# Altium schematic symbol library jlcpcb_2025_04_capacitors_extended_0805.schlib: 3281 symbols (part 1 of 18) (continued)
## 0805B104M500NT
designator C?  Capacitance: 100nF  (hidden comment: *)
Capacitor, Ceramic (MLCC), 100nF, ±20%, 50V, X7R, ±20%, SMD 0805; Manufacturer: FH(Guangdong Fenghua Advanced Tech); Manufacturer Part Number: 0805B104M500NT; Package Size: 0805; JLCPCB Basic Part: No; JLCPCB Part Number: C286511; Supplier 1: LCSC; Category: Capacitors - MLCC; Supplier Part Number 1: C286511; Tolerance: ±20%; Voltage Rating: 50V; Temperature Coefficient: X7R; RoHS: Yes; ComponentLink1Description: Datasheet; ComponentLink1URL: https://wmsc.lcsc.com/wmsc/upload/file/pdf/v2/lcsc/2304140030_FH--Guangdong-Fenghua-Advanced-Tech-0805B104M500NT_C286511.pdf; ComponentLink2Description: JLCPCB Part URL; ComponentLink2URL: https://jlcpcb.com/partdetail/C286511; ComponentLink3Description: LCSC Part URL; ComponentLink3URL: https://lcsc.com/product-detail/Multilayer-Ceramic-Capacitors-MLCC---SMD-SMT_FH-Guangdong-Fenghua-Advanced-Tech-FH-Guangdong-Fenghua-Advanced-Tech-0805B104M500NT_C286511.html
footprint CAP-0805 (0805 (2012M) Capacitor)
pins: 1, 2

## 0805B105K100CT
designator C?  Capacitance: 1uF  (hidden comment: *)
Capacitor, Ceramic (MLCC), 1uF, ±10%, 10V, X7R, ±10%, SMD 0805; Manufacturer: Walsin Tech Corp; Manufacturer Part Number: 0805B105K100CT; Package Size: 0805; JLCPCB Basic Part: No; JLCPCB Part Number: C366879; Supplier 1: LCSC; Category: Capacitors - MLCC; Supplier Part Number 1: C366879; Tolerance: ±10%; Voltage Rating: 10V; Temperature Coefficient: X7R; RoHS: Yes; ComponentLink1Description: Datasheet; ComponentLink1URL: https://wmsc.lcsc.com/wmsc/upload/file/pdf/v2/lcsc/2304140030_Walsin-Tech-Corp-0805B105K100CT_C366879.pdf; ComponentLink2Description: JLCPCB Part URL; ComponentLink2URL: https://jlcpcb.com/partdetail/C366879; ComponentLink3Description: LCSC Part URL; ComponentLink3URL: https://lcsc.com/product-detail/Multilayer-Ceramic-Capacitors-MLCC---SMD-SMT_Walsin-Tech-Corp-Walsin-Tech-Corp-0805B105K100CT_C366879.html
footprint CAP-0805 (0805 (2012M) Capacitor)
pins: 1, 2

## 0805B105K160CT
designator C?  Capacitance: 1uF  (hidden comment: *)
Capacitor, Ceramic (MLCC), 1uF, ±10%, 16V, X7R, ±10%, SMD 0805; Manufacturer: Walsin Tech Corp; Manufacturer Part Number: 0805B105K160CT; Package Size: 0805; JLCPCB Basic Part: No; JLCPCB Part Number: C396719; Supplier 1: LCSC; Category: Capacitors - MLCC; Supplier Part Number 1: C396719; Tolerance: ±10%; Voltage Rating: 16V; Temperature Coefficient: X7R; RoHS: Yes; ComponentLink1Description: Datasheet; ComponentLink1URL: https://wmsc.lcsc.com/wmsc/upload/file/pdf/v2/lcsc/2304140030_Walsin-Tech-Corp-0805B105K160CT_C396719.pdf; ComponentLink2Description: JLCPCB Part URL; ComponentLink2URL: https://jlcpcb.com/partdetail/C396719; ComponentLink3Description: LCSC Part URL; ComponentLink3URL: https://lcsc.com/product-detail/Multilayer-Ceramic-Capacitors-MLCC---SMD-SMT_Walsin-Tech-Corp-Walsin-Tech-Corp-0805B105K160CT_C396719.html
footprint CAP-0805 (0805 (2012M) Capacitor)
pins: 1, 2

## 0805B105K160NT
designator C?  Capacitance: 1uF  (hidden comment: *)
Capacitor, Ceramic (MLCC), 1uF, ±10%, 16V, X7R, ±10%, SMD 0805; Manufacturer: FH(Guangdong Fenghua Advanced Tech); Manufacturer Part Number: 0805B105K160NT; Package Size: 0805; JLCPCB Basic Part: No; JLCPCB Part Number: C89259; Supplier 1: LCSC; Category: Capacitors - MLCC; Supplier Part Number 1: C89259; Tolerance: ±10%; Voltage Rating: 16V; Temperature Coefficient: X7R; RoHS: Yes; ComponentLink1Description: Datasheet; ComponentLink1URL: https://wmsc.lcsc.com/wmsc/upload/file/pdf/v2/lcsc/2304140030_FH--Guangdong-Fenghua-Advanced-Tech-0805B105K160NT_C89259.pdf; ComponentLink2Description: JLCPCB Part URL; ComponentLink2URL: https://jlcpcb.com/partdetail/C89259; ComponentLink3Description: LCSC Part URL; ComponentLink3URL: https://lcsc.com/product-detail/Multilayer-Ceramic-Capacitors-MLCC---SMD-SMT_FH-Guangdong-Fenghua-Advanced-Tech-FH-Guangdong-Fenghua-Advanced-Tech-0805B105K160NT_C89259.html
footprint CAP-0805 (0805 (2012M) Capacitor)
pins: 1, 2

## 0805B105K250AT
designator C?  Capacitance: 1uF  (hidden comment: *)
Capacitor, Ceramic (MLCC), 1uF, ±10%, 25V, X7R, ±10%, SMD 0805; Manufacturer: FH(Guangdong Fenghua Advanced Tech); Manufacturer Part Number: 0805B105K250AT; Package Size: 0805; JLCPCB Basic Part: No; JLCPCB Part Number: C111769; Supplier 1: LCSC; Category: Capacitors - MLCC; Supplier Part Number 1: C111769; Tolerance: ±10%; Voltage Rating: 25V; Temperature Coefficient: X7R; RoHS: Yes; ComponentLink1Description: Datasheet; ComponentLink1URL: https://wmsc.lcsc.com/wmsc/upload/file/pdf/v2/lcsc/2304140030_FH--Guangdong-Fenghua-Advanced-Tech-0805B105K250AT_C111769.pdf; ComponentLink2Description: JLCPCB Part URL; ComponentLink2URL: https://jlcpcb.com/partdetail/C111769; ComponentLink3Description: LCSC Part URL; ComponentLink3URL: https://lcsc.com/product-detail/Multilayer-Ceramic-Capacitors-MLCC---SMD-SMT_FH-Guangdong-Fenghua-Advanced-Tech-FH-Guangdong-Fenghua-Advanced-Tech-0805B105K250AT_C111769.html
footprint CAP-0805 (0805 (2012M) Capacitor)
pins: 1, 2

## 0805B105K250CT
designator C?  Capacitance: 1uF  (hidden comment: *)
Capacitor, Ceramic (MLCC), 1uF, ±10%, 25V, X7R, ±10%, SMD 0805; Manufacturer: Walsin Tech Corp; Manufacturer Part Number: 0805B105K250CT; Package Size: 0805; JLCPCB Basic Part: No; JLCPCB Part Number: C152988; Supplier 1: LCSC; Category: Capacitors - MLCC; Supplier Part Number 1: C152988; Tolerance: ±10%; Voltage Rating: 25V; Temperature Coefficient: X7R; RoHS: Yes; ComponentLink1Description: Datasheet; ComponentLink1URL: https://wmsc.lcsc.com/wmsc/upload/file/pdf/v2/lcsc/2304140030_Walsin-Tech-Corp-0805B105K250CT_C152988.pdf; ComponentLink2Description: JLCPCB Part URL; ComponentLink2URL: https://jlcpcb.com/partdetail/C152988; ComponentLink3Description: LCSC Part URL; ComponentLink3URL: https://lcsc.com/product-detail/Multilayer-Ceramic-Capacitors-MLCC---SMD-SMT_Walsin-Tech-Corp-Walsin-Tech-Corp-0805B105K250CT_C152988.html
footprint CAP-0805 (0805 (2012M) Capacitor)
pins: 1, 2

## 0805B105K250NT
designator C?  Capacitance: 1uF  (hidden comment: *)
Capacitor, Ceramic (MLCC), 1uF, ±10%, 25V, X7R, ±10%, SMD 0805; Manufacturer: FH(Guangdong Fenghua Advanced Tech); Manufacturer Part Number: 0805B105K250NT; Package Size: 0805; JLCPCB Basic Part: No; JLCPCB Part Number: C89190; Supplier 1: LCSC; Category: Capacitors - MLCC; Supplier Part Number 1: C89190; Tolerance: ±10%; Voltage Rating: 25V; Temperature Coefficient: X7R; RoHS: Yes; ComponentLink1Description: Datasheet; ComponentLink1URL: https://wmsc.lcsc.com/wmsc/upload/file/pdf/v2/lcsc/1811111206_FH--Guangdong-Fenghua-Advanced-Tech-0805B105K250NT_C89190.pdf; ComponentLink2Description: JLCPCB Part URL; ComponentLink2URL: https://jlcpcb.com/partdetail/C89190; ComponentLink3Description: LCSC Part URL; ComponentLink3URL: https://lcsc.com/product-detail/Multilayer-Ceramic-Capacitors-MLCC---SMD-SMT_FH-Guangdong-Fenghua-Advanced-Tech-FH-Guangdong-Fenghua-Advanced-Tech-0805B105K250NT_C89190.html
footprint CAP-0805 (0805 (2012M) Capacitor)
pins: 1, 2

## 0805B105K500AT
designator C?  Capacitance: 1uF  (hidden comment: *)
Capacitor, Ceramic (MLCC), 1uF, ±10%, 50V, X7R, ±10%, SMD 0805; Manufacturer: FH(Guangdong Fenghua Advanced Tech); Manufacturer Part Number: 0805B105K500AT; Package Size: 0805; JLCPCB Basic Part: No; JLCPCB Part Number: C111768; Supplier 1: LCSC; Category: Capacitors - MLCC; Supplier Part Number 1: C111768; Tolerance: ±10%; Voltage Rating: 50V; Temperature Coefficient: X7R; RoHS: Yes; ComponentLink1Description: Datasheet; ComponentLink1URL: https://wmsc.lcsc.com/wmsc/upload/file/pdf/v2/lcsc/2304140030_FH--Guangdong-Fenghua-Advanced-Tech-0805B105K500AT_C111768.pdf; ComponentLink2Description: JLCPCB Part URL; ComponentLink2URL: https://jlcpcb.com/partdetail/C111768; ComponentLink3Description: LCSC Part URL; ComponentLink3URL: https://lcsc.com/product-detail/Multilayer-Ceramic-Capacitors-MLCC---SMD-SMT_FH-Guangdong-Fenghua-Advanced-Tech-FH-Guangdong-Fenghua-Advanced-Tech-0805B105K500AT_C111768.html
footprint CAP-0805 (0805 (2012M) Capacitor)
pins: 1, 2

## 0805B105K500CT
designator C?  Capacitance: 1uF  (hidden comment: *)
Capacitor, Ceramic (MLCC), 1uF, ±10%, 50V, X7R, ±10%, SMD 0805; Manufacturer: Walsin Tech Corp; Manufacturer Part Number: 0805B105K500CT; Package Size: 0805; JLCPCB Basic Part: No; JLCPCB Part Number: C99915; Supplier 1: LCSC; Category: Capacitors - MLCC; Supplier Part Number 1: C99915; Tolerance: ±10%; Voltage Rating: 50V; Temperature Coefficient: X7R; RoHS: Yes; ComponentLink1Description: Datasheet; ComponentLink1URL: https://wmsc.lcsc.com/wmsc/upload/file/pdf/v2/lcsc/2304140030_Walsin-Tech-Corp-0805B105K500CT_C99915.pdf; ComponentLink2Description: JLCPCB Part URL; ComponentLink2URL: https://jlcpcb.com/partdetail/C99915; ComponentLink3Description: LCSC Part URL; ComponentLink3URL: https://lcsc.com/product-detail/Multilayer-Ceramic-Capacitors-MLCC---SMD-SMT_Walsin-Tech-Corp-Walsin-Tech-Corp-0805B105K500CT_C99915.html
footprint CAP-0805 (0805 (2012M) Capacitor)
pins: 1, 2

## 0805B105K500NT
designator C?  Capacitance: 1uF  (hidden comment: *)
Capacitor, Ceramic (MLCC), 1uF, ±10%, 50V, X7R, ±10%, SMD 0805; Manufacturer: FH(Guangdong Fenghua Advanced Tech); Manufacturer Part Number: 0805B105K500NT; Package Size: 0805; JLCPCB Basic Part: No; JLCPCB Part Number: C215803; Supplier 1: LCSC; Category: Capacitors - MLCC; Supplier Part Number 1: C215803; Tolerance: ±10%; Voltage Rating: 50V; Temperature Coefficient: X7R; RoHS: Yes; ComponentLink1Description: Datasheet; ComponentLink1URL: https://wmsc.lcsc.com/wmsc/upload/file/pdf/v2/lcsc/2304140030_FH--Guangdong-Fenghua-Advanced-Tech-0805B105K500NT_C215803.pdf; ComponentLink2Description: JLCPCB Part URL; ComponentLink2URL: https://jlcpcb.com/partdetail/C215803; ComponentLink3Description: LCSC Part URL; ComponentLink3URL: https://lcsc.com/product-detail/Multilayer-Ceramic-Capacitors-MLCC---SMD-SMT_FH-Guangdong-Fenghua-Advanced-Tech-FH-Guangdong-Fenghua-Advanced-Tech-0805B105K500NT_C215803.html
footprint CAP-0805 (0805 (2012M) Capacitor)
pins: 1, 2

## 0805B105M250AT
designator C?  Capacitance: 1000000pF  (hidden comment: *)
Capacitor, Ceramic (MLCC), 1000000pF, ±20%, 25V, X7R, ±20%, SMD 0805; Manufacturer: FH (Guangdong Fenghua Advanced Tech); Manufacturer Part Number: 0805B105M250AT; Package Size: 0805; JLCPCB Basic Part: No; JLCPCB Part Number: C2857989; Supplier 1: LCSC; Category: Capacitors - MLCC; Supplier Part Number 1: C2857989; Tolerance: ±20%; Voltage Rating: 25V; Temperature Coefficient: X7R; RoHS: Yes; ComponentLink1Description: Datasheet; ComponentLink2Description: JLCPCB Part URL; ComponentLink2URL: https://jlcpcb.com/partdetail/C2857989; ComponentLink3Description: LCSC Part URL; ComponentLink3URL: https://lcsc.com/product-detail/Multilayer-Ceramic-Capacitors-MLCC---SMD-SMT_FH-Guangdong-Fenghua-Advanced-Tech-FH-Guangdong-Fenghua-Advanced-Tech-0805B105M250AT_C2857989.html
footprint CAP-0805 (0805 (2012M) Capacitor)
pins: 1, 2

## 0805B105M250NT
designator C?  Capacitance: 1000000pF  (hidden comment: *)
Capacitor, Ceramic (MLCC), 1000000pF, ±20%, 25V, X7R, ±20%, SMD 0805; Manufacturer: FH (Guangdong Fenghua Advanced Tech); Manufacturer Part Number: 0805B105M250NT; Package Size: 0805; JLCPCB Basic Part: No; JLCPCB Part Number: C303896; Supplier 1: LCSC; Category: Capacitors - MLCC; Supplier Part Number 1: C303896; Tolerance: ±20%; Voltage Rating: 25V; Temperature Coefficient: X7R; RoHS: Yes; ComponentLink1Description: Datasheet; ComponentLink1URL: https://wmsc.lcsc.com/wmsc/upload/file/pdf/v2/lcsc/2304140030_FH--Guangdong-Fenghua-Advanced-Tech-0805B105M250NT_C303896.pdf; ComponentLink2Description: JLCPCB Part URL; ComponentLink2URL: https://jlcpcb.com/partdetail/C303896; ComponentLink3Description: LCSC Part URL; ComponentLink3URL: https://lcsc.com/product-detail/Multilayer-Ceramic-Capacitors-MLCC---SMD-SMT_FH-Guangdong-Fenghua-Advanced-Tech-FH-Guangdong-Fenghua-Advanced-Tech-0805B105M250NT_C303896.html
footprint CAP-0805 (0805 (2012M) Capacitor)
pins: 1, 2

## 0805B105M500AT
designator C?  Capacitance: 1uF  (hidden comment: *)
Capacitor, Ceramic (MLCC), 1uF, 50V, SMD 0805; Manufacturer: FH (Guangdong Fenghua Advanced Tech); Manufacturer Part Number: 0805B105M500AT; Package Size: 0805; JLCPCB Basic Part: No; JLCPCB Part Number: C2857990; Supplier 1: LCSC; Category: Capacitors - MLCC; Supplier Part Number 1: C2857990; Voltage Rating: 50V; RoHS: Yes; ComponentLink1Description: Datasheet; ComponentLink2Description: JLCPCB Part URL; ComponentLink2URL: https://jlcpcb.com/partdetail/C2857990; ComponentLink3Description: LCSC Part URL; ComponentLink3URL: https://lcsc.com/product-detail/Multilayer-Ceramic-Capacitors-MLCC---SMD-SMT_FH-Guangdong-Fenghua-Advanced-Tech-FH-Guangdong-Fenghua-Advanced-Tech-0805B105M500AT_C2857990.html
footprint CAP-0805 (0805 (2012M) Capacitor)
pins: 1, 2

## 0805B105M500NT
designator C?  Capacitance: 1uF  (hidden comment: *)
Capacitor, Ceramic (MLCC), 1uF, 50V, X7R, SMD 0805; Manufacturer: FH (Guangdong Fenghua Advanced Tech); Manufacturer Part Number: 0805B105M500NT; Package Size: 0805; JLCPCB Basic Part: No; JLCPCB Part Number: C2913555; Supplier 1: LCSC; Category: Capacitors - MLCC; Supplier Part Number 1: C2913555; Voltage Rating: 50V; Temperature Coefficient: X7R; RoHS: Yes; ComponentLink1Description: Datasheet; ComponentLink1URL: https://wmsc.lcsc.com/wmsc/upload/file/pdf/v2/lcsc/2111011830_FH--Guangdong-Fenghua-Advanced-Tech-0805B105M500NT_C2913555.pdf; ComponentLink2Description: JLCPCB Part URL; ComponentLink2URL: https://jlcpcb.com/partdetail/C2913555; ComponentLink3Description: LCSC Part URL; ComponentLink3URL: https://lcsc.com/product-detail/Multilayer-Ceramic-Capacitors-MLCC---SMD-SMT_FH-Guangdong-Fenghua-Advanced-Tech-FH-Guangdong-Fenghua-Advanced-Tech-0805B105M500NT_C2913555.html
footprint CAP-0805 (0805 (2012M) Capacitor)
pins: 1, 2

## 0805B106K6R3CT
designator C?  Capacitance: 10uF  (hidden comment: *)
Capacitor, Ceramic (MLCC), 10uF, ±10%, 6.3V, X7R, ±10%, SMD 0805; Manufacturer: Walsin Tech Corp; Manufacturer Part Number: 0805B106K6R3CT; Package Size: 0805; JLCPCB Basic Part: No; JLCPCB Part Number: C396721; Supplier 1: LCSC; Category: Capacitors - MLCC; Supplier Part Number 1: C396721; Tolerance: ±10%; Voltage Rating: 6.3V; Temperature Coefficient: X7R; RoHS: Yes; ComponentLink1Description: Datasheet; ComponentLink1URL: https://wmsc.lcsc.com/wmsc/upload/file/pdf/v2/lcsc/2304140030_Walsin-Tech-Corp-0805B106K6R3CT_C396721.pdf; ComponentLink2Description: JLCPCB Part URL; ComponentLink2URL: https://jlcpcb.com/partdetail/C396721; ComponentLink3Description: LCSC Part URL; ComponentLink3URL: https://lcsc.com/product-detail/Multilayer-Ceramic-Capacitors-MLCC---SMD-SMT_Walsin-Tech-Corp-Walsin-Tech-Corp-0805B106K6R3CT_C396721.html
footprint CAP-0805 (0805 (2012M) Capacitor)
pins: 1, 2

## 0805B106K6R3NT
designator C?  Capacitance: 10uF  (hidden comment: *)
Capacitor, Ceramic (MLCC), 10uF, ±10%, 6.3V, X7R, ±10%, SMD 0805; Manufacturer: FH(Guangdong Fenghua Advanced Tech); Manufacturer Part Number: 0805B106K6R3NT; Package Size: 0805; JLCPCB Basic Part: No; JLCPCB Part Number: C105483; Supplier 1: LCSC; Category: Capacitors - MLCC; Supplier Part Number 1: C105483; Tolerance: ±10%; Voltage Rating: 6.3V; Temperature Coefficient: X7R; RoHS: Yes; ComponentLink1Description: Datasheet; ComponentLink1URL: https://wmsc.lcsc.com/wmsc/upload/file/pdf/v2/lcsc/2304140030_FH--Guangdong-Fenghua-Advanced-Tech-0805B106K6R3NT_C105483.pdf; ComponentLink2Description: JLCPCB Part URL; ComponentLink2URL: https://jlcpcb.com/partdetail/C105483; ComponentLink3Description: LCSC Part URL; ComponentLink3URL: https://lcsc.com/product-detail/Multilayer-Ceramic-Capacitors-MLCC---SMD-SMT_FH-Guangdong-Fenghua-Advanced-Tech-FH-Guangdong-Fenghua-Advanced-Tech-0805B106K6R3NT_C105483.html
footprint CAP-0805 (0805 (2012M) Capacitor)
pins: 1, 2

## 0805B106K100CT
designator C?  Capacitance: 10uF  (hidden comment: *)
Capacitor, Ceramic (MLCC), 10uF, ±10%, 10V, X7R, ±10%, SMD 0805; Manufacturer: Walsin Tech Corp; Manufacturer Part Number: 0805B106K100CT; Package Size: 0805; JLCPCB Basic Part: No; JLCPCB Part Number: C396720; Supplier 1: LCSC; Category: Capacitors - MLCC; Supplier Part Number 1: C396720; Tolerance: ±10%; Voltage Rating: 10V; Temperature Coefficient: X7R; RoHS: Yes; ComponentLink1Description: Datasheet; ComponentLink1URL: https://wmsc.lcsc.com/wmsc/upload/file/pdf/v2/lcsc/2304140030_Walsin-Tech-Corp-0805B106K100CT_C396720.pdf; ComponentLink2Description: JLCPCB Part URL; ComponentLink2URL: https://jlcpcb.com/partdetail/C396720; ComponentLink3Description: LCSC Part URL; ComponentLink3URL: https://lcsc.com/product-detail/Multilayer-Ceramic-Capacitors-MLCC---SMD-SMT_Walsin-Tech-Corp-Walsin-Tech-Corp-0805B106K100CT_C396720.html
footprint CAP-0805 (0805 (2012M) Capacitor)
pins: 1, 2

## 0805B106K100NT
designator C?  Capacitance: 10uF  (hidden comment: *)
Capacitor, Ceramic (MLCC), 10uF, ±10%, 10V, X7R, ±10%, SMD 0805; Manufacturer: FH(Guangdong Fenghua Advanced Tech); Manufacturer Part Number: 0805B106K100NT; Package Size: 0805; JLCPCB Basic Part: No; JLCPCB Part Number: C90544; Supplier 1: LCSC; Category: Capacitors - MLCC; Supplier Part Number 1: C90544; Tolerance: ±10%; Voltage Rating: 10V; Temperature Coefficient: X7R; RoHS: Yes; ComponentLink1Description: Datasheet; ComponentLink1URL: https://wmsc.lcsc.com/wmsc/upload/file/pdf/v2/lcsc/2304140030_FH--Guangdong-Fenghua-Advanced-Tech-0805B106K100NT_C90544.pdf; ComponentLink2Description: JLCPCB Part URL; ComponentLink2URL: https://jlcpcb.com/partdetail/C90544; ComponentLink3Description: LCSC Part URL; ComponentLink3URL: https://lcsc.com/product-detail/Multilayer-Ceramic-Capacitors-MLCC---SMD-SMT_FH-Guangdong-Fenghua-Advanced-Tech-FH-Guangdong-Fenghua-Advanced-Tech-0805B106K100NT_C90544.html
footprint CAP-0805 (0805 (2012M) Capacitor)
pins: 1, 2

## 0805B106K160NT
designator C?  Capacitance: 10uF  (hidden comment: *)
Capacitor, Ceramic (MLCC), 10uF, ±10%, 16V, X7R, ±10%, SMD 0805; Manufacturer: FH(Guangdong Fenghua Advanced Tech); Manufacturer Part Number: 0805B106K160NT; Package Size: 0805; JLCPCB Basic Part: No; JLCPCB Part Number: C92341; Supplier 1: LCSC; Category: Capacitors - MLCC; Supplier Part Number 1: C92341; Tolerance: ±10%; Voltage Rating: 16V; Temperature Coefficient: X7R; RoHS: Yes; ComponentLink1Description: Datasheet; ComponentLink1URL: https://wmsc.lcsc.com/wmsc/upload/file/pdf/v2/lcsc/2304140030_FH--Guangdong-Fenghua-Advanced-Tech-0805B106K160NT_C92341.pdf; ComponentLink2Description: JLCPCB Part URL; ComponentLink2URL: https://jlcpcb.com/partdetail/C92341; ComponentLink3Description: LCSC Part URL; ComponentLink3URL: https://lcsc.com/product-detail/Multilayer-Ceramic-Capacitors-MLCC---SMD-SMT_FH-Guangdong-Fenghua-Advanced-Tech-FH-Guangdong-Fenghua-Advanced-Tech-0805B106K160NT_C92341.html
footprint CAP-0805 (0805 (2012M) Capacitor)
pins: 1, 2

## 0805B121K500CT
designator C?  Capacitance: 120pF  (hidden comment: *)
Capacitor, Ceramic (MLCC), 120pF, ±10%, 50V, X7R, ±10%, SMD 0805; Manufacturer: Walsin Tech Corp; Manufacturer Part Number: 0805B121K500CT; Package Size: 0805; JLCPCB Basic Part: No; JLCPCB Part Number: C152889; Supplier 1: LCSC; Category: Capacitors - MLCC; Supplier Part Number 1: C152889; Tolerance: ±10%; Voltage Rating: 50V; Temperature Coefficient: X7R; RoHS: Yes; ComponentLink1Description: Datasheet; ComponentLink1URL: https://wmsc.lcsc.com/wmsc/upload/file/pdf/v2/lcsc/2304140030_Walsin-Tech-Corp-0805B121K500CT_C152889.pdf; ComponentLink2Description: JLCPCB Part URL; ComponentLink2URL: https://jlcpcb.com/partdetail/C152889; ComponentLink3Description: LCSC Part URL; ComponentLink3URL: https://lcsc.com/product-detail/Multilayer-Ceramic-Capacitors-MLCC---SMD-SMT_Walsin-Tech-Corp-Walsin-Tech-Corp-0805B121K500CT_C152889.html
footprint CAP-0805 (0805 (2012M) Capacitor)
pins: 1, 2

## 0805B121K501CT
designator C?  Capacitance: 120pF  (hidden comment: *)
Capacitor, Ceramic (MLCC), 120pF, ±10%, 500V, X7R, ±10%, SMD 0805; Manufacturer: Walsin Tech Corp; Manufacturer Part Number: 0805B121K501CT; Package Size: 0805; JLCPCB Basic Part: No; JLCPCB Part Number: C2843579; Supplier 1: LCSC; Category: Capacitors - MLCC; Supplier Part Number 1: C2843579; Tolerance: ±10%; Voltage Rating: 500V; Temperature Coefficient: X7R; RoHS: Yes; ComponentLink1Description: Datasheet; ComponentLink1URL: https://wmsc.lcsc.com/wmsc/upload/file/pdf/v2/lcsc/2108072030_Walsin-Tech-Corp-0805B121K501CT_C2843579.pdf; ComponentLink2Description: JLCPCB Part URL; ComponentLink2URL: https://jlcpcb.com/partdetail/C2843579; ComponentLink3Description: LCSC Part URL; ComponentLink3URL: https://lcsc.com/product-detail/Multilayer-Ceramic-Capacitors-MLCC---SMD-SMT_Walsin-Tech-Corp-Walsin-Tech-Corp-0805B121K501CT_C2843579.html
footprint CAP-0805 (0805 (2012M) Capacitor)
pins: 1, 2

## 0805B122K101CT
designator C?  Capacitance: 1.2nF  (hidden comment: *)
Capacitor, Ceramic (MLCC), 1.2nF, ±10%, 100V, X7R, ±10%, SMD 0805; Manufacturer: Walsin Tech Corp; Manufacturer Part Number: 0805B122K101CT; Package Size: 0805; JLCPCB Basic Part: No; JLCPCB Part Number: C384772; Supplier 1: LCSC; Category: Capacitors - MLCC; Supplier Part Number 1: C384772; Tolerance: ±10%; Voltage Rating: 100V; Temperature Coefficient: X7R; RoHS: Yes; ComponentLink1Description: Datasheet; ComponentLink1URL: https://wmsc.lcsc.com/wmsc/upload/file/pdf/v2/lcsc/2304140030_Walsin-Tech-Corp-0805B122K101CT_C384772.pdf; ComponentLink2Description: JLCPCB Part URL; ComponentLink2URL: https://jlcpcb.com/partdetail/C384772; ComponentLink3Description: LCSC Part URL; ComponentLink3URL: https://lcsc.com/product-detail/Multilayer-Ceramic-Capacitors-MLCC---SMD-SMT_Walsin-Tech-Corp-Walsin-Tech-Corp-0805B122K101CT_C384772.html
footprint CAP-0805 (0805 (2012M) Capacitor)
pins: 1, 2

## 0805B122K201NT
designator C?  Capacitance: 1200pF  (hidden comment: *)
Capacitor, Ceramic (MLCC), 1200pF, ±10%, 200V, X7R, ±10%, SMD 0805; Manufacturer: FH (Guangdong Fenghua Advanced Tech); Manufacturer Part Number: 0805B122K201NT; Package Size: 0805; JLCPCB Basic Part: No; JLCPCB Part Number: C880418; Supplier 1: LCSC; Category: Capacitors - MLCC; Supplier Part Number 1: C880418; Tolerance: ±10%; Voltage Rating: 200V; Temperature Coefficient: X7R; RoHS: Yes; ComponentLink1Description: Datasheet; ComponentLink1URL: https://wmsc.lcsc.com/wmsc/upload/file/pdf/v2/lcsc/2304140030_FH--Guangdong-Fenghua-Advanced-Tech-0805B122K201NT_C880418.pdf; ComponentLink2Description: JLCPCB Part URL; ComponentLink2URL: https://jlcpcb.com/partdetail/C880418; ComponentLink3Description: LCSC Part URL; ComponentLink3URL: https://lcsc.com/product-detail/Multilayer-Ceramic-Capacitors-MLCC---SMD-SMT_FH-Guangdong-Fenghua-Advanced-Tech-FH-Guangdong-Fenghua-Advanced-Tech-0805B122K201NT_C880418.html
footprint CAP-0805 (0805 (2012M) Capacitor)
pins: 1, 2

## 0805B122K500CT
designator C?  Capacitance: 1.2nF  (hidden comment: *)
Capacitor, Ceramic (MLCC), 1.2nF, ±10%, 50V, X7R, ±10%, SMD 0805; Manufacturer: Walsin Tech Corp; Manufacturer Part Number: 0805B122K500CT; Package Size: 0805; JLCPCB Basic Part: No; JLCPCB Part Number: C152888; Supplier 1: LCSC; Category: Capacitors - MLCC; Supplier Part Number 1: C152888; Tolerance: ±10%; Voltage Rating: 50V; Temperature Coefficient: X7R; RoHS: Yes; ComponentLink1Description: Datasheet; ComponentLink1URL: https://wmsc.lcsc.com/wmsc/upload/file/pdf/v2/lcsc/2304140030_Walsin-Tech-Corp-0805B122K500CT_C152888.pdf; ComponentLink2Description: JLCPCB Part URL; ComponentLink2URL: https://jlcpcb.com/partdetail/C152888; ComponentLink3Description: LCSC Part URL; ComponentLink3URL: https://lcsc.com/product-detail/Multilayer-Ceramic-Capacitors-MLCC---SMD-SMT_Walsin-Tech-Corp-Walsin-Tech-Corp-0805B122K500CT_C152888.html
footprint CAP-0805 (0805 (2012M) Capacitor)
pins: 1, 2

## 0805B122K500NT
designator C?  Capacitance: 1.2nF  (hidden comment: *)
Capacitor, Ceramic (MLCC), 1.2nF, ±10%, 50V, X7R, ±10%, SMD 0805; Manufacturer: FH(Guangdong Fenghua Advanced Tech); Manufacturer Part Number: 0805B122K500NT; Package Size: 0805; JLCPCB Basic Part: No; JLCPCB Part Number: C1714; Supplier 1: LCSC; Category: Capacitors - MLCC; Supplier Part Number 1: C1714; Tolerance: ±10%; Voltage Rating: 50V; Temperature Coefficient: X7R; RoHS: Yes; ComponentLink1Description: Datasheet; ComponentLink1URL: https://wmsc.lcsc.com/wmsc/upload/file/pdf/v2/lcsc/2304140030_FH--Guangdong-Fenghua-Advanced-Tech-0805B122K500NT_C1714.pdf; ComponentLink2Description: JLCPCB Part URL; ComponentLink2URL: https://jlcpcb.com/partdetail/C1714; ComponentLink3Description: LCSC Part URL; ComponentLink3URL: https://lcsc.com/product-detail/Multilayer-Ceramic-Capacitors-MLCC---SMD-SMT_FH-Guangdong-Fenghua-Advanced-Tech-FH-Guangdong-Fenghua-Advanced-Tech-0805B122K500NT_C1714.html
footprint CAP-0805 (0805 (2012M) Capacitor)
pins: 1, 2

## 0805B123K500CT
designator C?  Capacitance: 12nF  (hidden comment: *)
Capacitor, Ceramic (MLCC), 12nF, ±10%, 50V, X7R, ±10%, SMD 0805; Manufacturer: Walsin Tech Corp; Manufacturer Part Number: 0805B123K500CT; Package Size: 0805; JLCPCB Basic Part: No; JLCPCB Part Number: C123614; Supplier 1: LCSC; Category: Capacitors - MLCC; Supplier Part Number 1: C123614; Tolerance: ±10%; Voltage Rating: 50V; Temperature Coefficient: X7R; RoHS: Yes; ComponentLink1Description: Datasheet; ComponentLink1URL: https://wmsc.lcsc.com/wmsc/upload/file/pdf/v2/lcsc/2304140030_Walsin-Tech-Corp-0805B123K500CT_C123614.pdf; ComponentLink2Description: JLCPCB Part URL; ComponentLink2URL: https://jlcpcb.com/partdetail/C123614; ComponentLink3Description: LCSC Part URL; ComponentLink3URL: https://lcsc.com/product-detail/Multilayer-Ceramic-Capacitors-MLCC---SMD-SMT_Walsin-Tech-Corp-Walsin-Tech-Corp-0805B123K500CT_C123614.html
footprint CAP-0805 (0805 (2012M) Capacitor)
pins: 1, 2

## 0805B123K500NT
designator C?  Capacitance: 12nF  (hidden comment: *)
Capacitor, Ceramic (MLCC), 12nF, ±10%, 50V, X7R, ±10%, SMD 0805; Manufacturer: FH(Guangdong Fenghua Advanced Tech); Manufacturer Part Number: 0805B123K500NT; Package Size: 0805; JLCPCB Basic Part: No; JLCPCB Part Number: C1715; Supplier 1: LCSC; Category: Capacitors - MLCC; Supplier Part Number 1: C1715; Tolerance: ±10%; Voltage Rating: 50V; Temperature Coefficient: X7R; RoHS: Yes; ComponentLink1Description: Datasheet; ComponentLink1URL: https://wmsc.lcsc.com/wmsc/upload/file/pdf/v2/lcsc/2304140030_FH--Guangdong-Fenghua-Advanced-Tech-0805B123K500NT_C1715.pdf; ComponentLink2Description: JLCPCB Part URL; ComponentLink2URL: https://jlcpcb.com/partdetail/C1715; ComponentLink3Description: LCSC Part URL; ComponentLink3URL: https://lcsc.com/product-detail/Multilayer-Ceramic-Capacitors-MLCC---SMD-SMT_FH-Guangdong-Fenghua-Advanced-Tech-FH-Guangdong-Fenghua-Advanced-Tech-0805B123K500NT_C1715.html
footprint CAP-0805 (0805 (2012M) Capacitor)
pins: 1, 2

## 0805B124K500
designator C?  Capacitance: 120nF  (hidden comment: *)
Capacitor, Ceramic (MLCC), 120nF, ±10%, 50V, X7R, ±10%, SMD 0805; Manufacturer: Walsin Tech Corp; Manufacturer Part Number: 0805B124K500; Package Size: 0805; JLCPCB Basic Part: No; JLCPCB Part Number: C152887; Supplier 1: LCSC; Category: Capacitors - MLCC; Supplier Part Number 1: C152887; Tolerance: ±10%; Voltage Rating: 50V; Temperature Coefficient: X7R; RoHS: Yes; ComponentLink1Description: Datasheet; ComponentLink1URL: https://wmsc.lcsc.com/wmsc/upload/file/pdf/v2/lcsc/2304140030_Walsin-Tech-Corp-0805B124K500_C152887.pdf; ComponentLink2Description: JLCPCB Part URL; ComponentLink2URL: https://jlcpcb.com/partdetail/C152887; ComponentLink3Description: LCSC Part URL; ComponentLink3URL: https://lcsc.com/product-detail/Multilayer-Ceramic-Capacitors-MLCC---SMD-SMT_Walsin-Tech-Corp-Walsin-Tech-Corp-0805B124K500_C152887.html
footprint CAP-0805 (0805 (2012M) Capacitor)
pins: 1, 2

## 0805B124K500NT_C55420
designator C?  Capacitance: 120nF  (hidden comment: *)
Capacitor, Ceramic (MLCC), 120nF, ±10%, 50V, X7R, ±10%, SMD 0805; Manufacturer: FH(Guangdong Fenghua Advanced Tech); Manufacturer Part Number: 0805B124K500NT; Package Size: 0805; JLCPCB Basic Part: No; JLCPCB Part Number: C55420; Supplier 1: LCSC; Category: Capacitors - MLCC; Supplier Part Number 1: C55420; Tolerance: ±10%; Voltage Rating: 50V; Temperature Coefficient: X7R; RoHS: Yes; ComponentLink1Description: Datasheet; ComponentLink1URL: https://wmsc.lcsc.com/wmsc/upload/file/pdf/v2/lcsc/2304140030_FH--Guangdong-Fenghua-Advanced-Tech-0805B124K500NT_C55420.pdf; ComponentLink2Description: JLCPCB Part URL; ComponentLink2URL: https://jlcpcb.com/partdetail/C55420; ComponentLink3Description: LCSC Part URL; ComponentLink3URL: https://lcsc.com/product-detail/Multilayer-Ceramic-Capacitors-MLCC---SMD-SMT_FH-Guangdong-Fenghua-Advanced-Tech-FH-Guangdong-Fenghua-Advanced-Tech-0805B124K500NT_C55420.html
footprint CAP-0805 (0805 (2012M) Capacitor)
pins: 1, 2

## 0805B124K500NT_C2830719
designator C?  Capacitance: 120nF  (hidden comment: *)
Capacitor, Ceramic (MLCC), 120nF, ±10%, 50V, ±10%, SMD 0805; Manufacturer: FH-BK(Guangdong Fenghua Bangke Elec); Manufacturer Part Number: 0805B124K500NT; Package Size: 0805; JLCPCB Basic Part: No; JLCPCB Part Number: C2830719; Supplier 1: LCSC; Category: Capacitors - MLCC; Supplier Part Number 1: C2830719; Tolerance: ±10%; Voltage Rating: 50V; RoHS: Yes; ComponentLink1Description: Datasheet; ComponentLink1URL: https://wmsc.lcsc.com/wmsc/upload/file/pdf/v2/lcsc/2105241611_FH-BK-Guangdong-Fenghua-Bangke-Elec-0805B124K500NT_C2830719.pdf; ComponentLink2Description: JLCPCB Part URL; ComponentLink2URL: https://jlcpcb.com/partdetail/C2830719; ComponentLink3Description: LCSC Part URL; ComponentLink3URL: https://lcsc.com/product-detail/Multilayer-Ceramic-Capacitors-MLCC---SMD-SMT_FH-BKGuangdong-Fenghua-Bangke-Elec-FH-BKGuangdong-Fenghua-Bangke-Elec-0805B124K500NT_C2830719.html
footprint CAP-0805 (0805 (2012M) Capacitor)
pins: 1, 2

## 0805B151K500CT
designator C?  Capacitance: 150pF  (hidden comment: *)
Capacitor, Ceramic (MLCC), 150pF, ±10%, 50V, X7R, ±10%, SMD 0805; Manufacturer: Walsin Tech Corp; Manufacturer Part Number: 0805B151K500CT; Package Size: 0805; JLCPCB Basic Part: No; JLCPCB Part Number: C152886; Supplier 1: LCSC; Category: Capacitors - MLCC; Supplier Part Number 1: C152886; Tolerance: ±10%; Voltage Rating: 50V; Temperature Coefficient: X7R; RoHS: Yes; ComponentLink1Description: Datasheet; ComponentLink1URL: https://wmsc.lcsc.com/wmsc/upload/file/pdf/v2/lcsc/2304140030_Walsin-Tech-Corp-0805B151K500CT_C152886.pdf; ComponentLink2Description: JLCPCB Part URL; ComponentLink2URL: https://jlcpcb.com/partdetail/C152886; ComponentLink3Description: LCSC Part URL; ComponentLink3URL: https://lcsc.com/product-detail/Multilayer-Ceramic-Capacitors-MLCC---SMD-SMT_Walsin-Tech-Corp-Walsin-Tech-Corp-0805B151K500CT_C152886.html
footprint CAP-0805 (0805 (2012M) Capacitor)
pins: 1, 2

## 0805B151K500NT
designator C?  Capacitance: 150pF  (hidden comment: *)
Capacitor, Ceramic (MLCC), 150pF, ±10%, 50V, X7R, ±10%, SMD 0805; Manufacturer: FH(Guangdong Fenghua Advanced Tech); Manufacturer Part Number: 0805B151K500NT; Package Size: 0805; JLCPCB Basic Part: No; JLCPCB Part Number: C1716; Supplier 1: LCSC; Category: Capacitors - MLCC; Supplier Part Number 1: C1716; Tolerance: ±10%; Voltage Rating: 50V; Temperature Coefficient: X7R; RoHS: Yes; ComponentLink1Description: Datasheet; ComponentLink1URL: https://wmsc.lcsc.com/wmsc/upload/file/pdf/v2/lcsc/2304140030_FH--Guangdong-Fenghua-Advanced-Tech-0805B151K500NT_C1716.pdf; ComponentLink2Description: JLCPCB Part URL; ComponentLink2URL: https://jlcpcb.com/partdetail/C1716; ComponentLink3Description: LCSC Part URL; ComponentLink3URL: https://lcsc.com/product-detail/Multilayer-Ceramic-Capacitors-MLCC---SMD-SMT_FH-Guangdong-Fenghua-Advanced-Tech-FH-Guangdong-Fenghua-Advanced-Tech-0805B151K500NT_C1716.html
footprint CAP-0805 (0805 (2012M) Capacitor)
pins: 1, 2

## 0805B151K501CT
designator C?  Capacitance: 150pF  (hidden comment: *)
Capacitor, Ceramic (MLCC), 150pF, ±10%, 500V, X7R, ±10%, SMD 0805; Manufacturer: Walsin Tech Corp; Manufacturer Part Number: 0805B151K501CT; Package Size: 0805; JLCPCB Basic Part: No; JLCPCB Part Number: C152986; Supplier 1: LCSC; Category: Capacitors - MLCC; Supplier Part Number 1: C152986; Tolerance: ±10%; Voltage Rating: 500V; Temperature Coefficient: X7R; RoHS: Yes; ComponentLink1Description: Datasheet; ComponentLink1URL: https://wmsc.lcsc.com/wmsc/upload/file/pdf/v2/lcsc/2304140030_Walsin-Tech-Corp-0805B151K501CT_C152986.pdf; ComponentLink2Description: JLCPCB Part URL; ComponentLink2URL: https://jlcpcb.com/partdetail/C152986; ComponentLink3Description: LCSC Part URL; ComponentLink3URL: https://lcsc.com/product-detail/Multilayer-Ceramic-Capacitors-MLCC---SMD-SMT_Walsin-Tech-Corp-Walsin-Tech-Corp-0805B151K501CT_C152986.html
footprint CAP-0805 (0805 (2012M) Capacitor)
pins: 1, 2

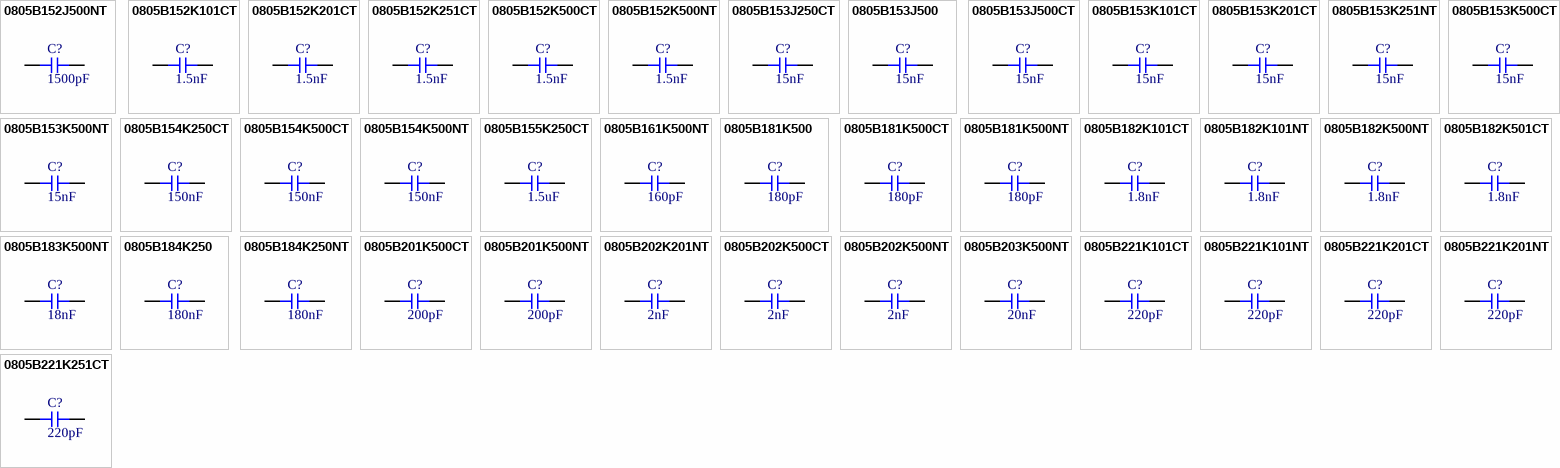
[diagram p3: symbols 0805B152J500NT to 0805B221K251CT]

## 0805B152J500NT
designator C?  Capacitance: 1500pF  (hidden comment: *)
Capacitor, Ceramic (MLCC), 1500pF, ±5%, 50V, X7R, ±5%, SMD 0805; Manufacturer: FH (Guangdong Fenghua Advanced Tech); Manufacturer Part Number: 0805B152J500NT; Package Size: 0805; JLCPCB Basic Part: No; JLCPCB Part Number: C880314; Supplier 1: LCSC; Category: Capacitors - MLCC; Supplier Part Number 1: C880314; Tolerance: ±5%; Voltage Rating: 50V; Temperature Coefficient: X7R; RoHS: Yes; ComponentLink1Description: Datasheet; ComponentLink1URL: https://wmsc.lcsc.com/wmsc/upload/file/pdf/v2/lcsc/2304140030_FH--Guangdong-Fenghua-Advanced-Tech-0805B152J500NT_C880314.pdf; ComponentLink2Description: JLCPCB Part URL; ComponentLink2URL: https://jlcpcb.com/partdetail/C880314; ComponentLink3Description: LCSC Part URL; ComponentLink3URL: https://lcsc.com/product-detail/Multilayer-Ceramic-Capacitors-MLCC---SMD-SMT_FH-Guangdong-Fenghua-Advanced-Tech-FH-Guangdong-Fenghua-Advanced-Tech-0805B152J500NT_C880314.html
footprint CAP-0805 (0805 (2012M) Capacitor)
pins: 1, 2

## 0805B152K101CT
designator C?  Capacitance: 1.5nF  (hidden comment: *)
Capacitor, Ceramic (MLCC), 1.5nF, ±10%, 100V, X7R, ±10%, SMD 0805; Manufacturer: Walsin Tech Corp; Manufacturer Part Number: 0805B152K101CT; Package Size: 0805; JLCPCB Basic Part: No; JLCPCB Part Number: C77457; Supplier 1: LCSC; Category: Capacitors - MLCC; Supplier Part Number 1: C77457; Tolerance: ±10%; Voltage Rating: 100V; Temperature Coefficient: X7R; RoHS: Yes; ComponentLink1Description: Datasheet; ComponentLink1URL: https://wmsc.lcsc.com/wmsc/upload/file/pdf/v2/lcsc/2304140030_Walsin-Tech-Corp-0805B152K101CT_C77457.pdf; ComponentLink2Description: JLCPCB Part URL; ComponentLink2URL: https://jlcpcb.com/partdetail/C77457; ComponentLink3Description: LCSC Part URL; ComponentLink3URL: https://lcsc.com/product-detail/Multilayer-Ceramic-Capacitors-MLCC---SMD-SMT_Walsin-Tech-Corp-Walsin-Tech-Corp-0805B152K101CT_C77457.html
footprint CAP-0805 (0805 (2012M) Capacitor)
pins: 1, 2

## 0805B152K201CT
designator C?  Capacitance: 1.5nF  (hidden comment: *)
Capacitor, Ceramic (MLCC), 1.5nF, ±10%, 200V, X7R, ±10%, SMD 0805; Manufacturer: Walsin Tech Corp; Manufacturer Part Number: 0805B152K201CT; Package Size: 0805; JLCPCB Basic Part: No; JLCPCB Part Number: C575471; Supplier 1: LCSC; Category: Capacitors - MLCC; Supplier Part Number 1: C575471; Tolerance: ±10%; Voltage Rating: 200V; Temperature Coefficient: X7R; RoHS: Yes; ComponentLink1Description: Datasheet; ComponentLink1URL: https://wmsc.lcsc.com/wmsc/upload/file/pdf/v2/lcsc/2304140030_Walsin-Tech-Corp-0805B152K201CT_C575471.pdf; ComponentLink2Description: JLCPCB Part URL; ComponentLink2URL: https://jlcpcb.com/partdetail/C575471; ComponentLink3Description: LCSC Part URL; ComponentLink3URL: https://lcsc.com/product-detail/Multilayer-Ceramic-Capacitors-MLCC---SMD-SMT_Walsin-Tech-Corp-Walsin-Tech-Corp-0805B152K201CT_C575471.html
footprint CAP-0805 (0805 (2012M) Capacitor)
pins: 1, 2

## 0805B152K251CT
designator C?  Capacitance: 1.5nF  (hidden comment: *)
Capacitor, Ceramic (MLCC), 1.5nF, ±10%, 250V, X7R, ±10%, SMD 0805; Manufacturer: Walsin Tech Corp; Manufacturer Part Number: 0805B152K251CT; Package Size: 0805; JLCPCB Basic Part: No; JLCPCB Part Number: C152885; Supplier 1: LCSC; Category: Capacitors - MLCC; Supplier Part Number 1: C152885; Tolerance: ±10%; Voltage Rating: 250V; Temperature Coefficient: X7R; RoHS: Yes; ComponentLink1Description: Datasheet; ComponentLink1URL: https://wmsc.lcsc.com/wmsc/upload/file/pdf/v2/lcsc/2304140030_Walsin-Tech-Corp-0805B152K251CT_C152885.pdf; ComponentLink2Description: JLCPCB Part URL; ComponentLink2URL: https://jlcpcb.com/partdetail/C152885; ComponentLink3Description: LCSC Part URL; ComponentLink3URL: https://lcsc.com/product-detail/Multilayer-Ceramic-Capacitors-MLCC---SMD-SMT_Walsin-Tech-Corp-Walsin-Tech-Corp-0805B152K251CT_C152885.html
footprint CAP-0805 (0805 (2012M) Capacitor)
pins: 1, 2

## 0805B152K500CT
designator C?  Capacitance: 1.5nF  (hidden comment: *)
Capacitor, Ceramic (MLCC), 1.5nF, ±10%, 50V, X7R, ±10%, SMD 0805; Manufacturer: Walsin Tech Corp; Manufacturer Part Number: 0805B152K500CT; Package Size: 0805; JLCPCB Basic Part: No; JLCPCB Part Number: C152884; Supplier 1: LCSC; Category: Capacitors - MLCC; Supplier Part Number 1: C152884; Tolerance: ±10%; Voltage Rating: 50V; Temperature Coefficient: X7R; RoHS: Yes; ComponentLink1Description: Datasheet; ComponentLink1URL: https://wmsc.lcsc.com/wmsc/upload/file/pdf/v2/lcsc/2304140030_Walsin-Tech-Corp-0805B152K500CT_C152884.pdf; ComponentLink2Description: JLCPCB Part URL; ComponentLink2URL: https://jlcpcb.com/partdetail/C152884; ComponentLink3Description: LCSC Part URL; ComponentLink3URL: https://lcsc.com/product-detail/Multilayer-Ceramic-Capacitors-MLCC---SMD-SMT_Walsin-Tech-Corp-Walsin-Tech-Corp-0805B152K500CT_C152884.html
footprint CAP-0805 (0805 (2012M) Capacitor)
pins: 1, 2

## 0805B152K500NT
designator C?  Capacitance: 1.5nF  (hidden comment: *)
Capacitor, Ceramic (MLCC), 1.5nF, ±10%, 50V, X7R, ±10%, SMD 0805; Manufacturer: FH(Guangdong Fenghua Advanced Tech); Manufacturer Part Number: 0805B152K500NT; Package Size: 0805; JLCPCB Basic Part: No; JLCPCB Part Number: C1717; Supplier 1: LCSC; Category: Capacitors - MLCC; Supplier Part Number 1: C1717; Tolerance: ±10%; Voltage Rating: 50V; Temperature Coefficient: X7R; RoHS: Yes; ComponentLink1Description: Datasheet; ComponentLink1URL: https://wmsc.lcsc.com/wmsc/upload/file/pdf/v2/lcsc/2304140030_FH--Guangdong-Fenghua-Advanced-Tech-0805B152K500NT_C1717.pdf; ComponentLink2Description: JLCPCB Part URL; ComponentLink2URL: https://jlcpcb.com/partdetail/C1717; ComponentLink3Description: LCSC Part URL; ComponentLink3URL: https://lcsc.com/product-detail/Multilayer-Ceramic-Capacitors-MLCC---SMD-SMT_FH-Guangdong-Fenghua-Advanced-Tech-FH-Guangdong-Fenghua-Advanced-Tech-0805B152K500NT_C1717.html
footprint CAP-0805 (0805 (2012M) Capacitor)
pins: 1, 2

## 0805B153J250CT
designator C?  Capacitance: 15nF  (hidden comment: *)
Capacitor, Ceramic (MLCC), 15nF, ±5%, 25V, X7R, ±5%, SMD 0805; Manufacturer: Walsin Tech Corp; Manufacturer Part Number: 0805B153J250CT; Package Size: 0805; JLCPCB Basic Part: No; JLCPCB Part Number: C384769; Supplier 1: LCSC; Category: Capacitors - MLCC; Supplier Part Number 1: C384769; Tolerance: ±5%; Voltage Rating: 25V; Temperature Coefficient: X7R; RoHS: Yes; ComponentLink1Description: Datasheet; ComponentLink1URL: https://wmsc.lcsc.com/wmsc/upload/file/pdf/v2/lcsc/2304140030_Walsin-Tech-Corp-0805B153J250CT_C384769.pdf; ComponentLink2Description: JLCPCB Part URL; ComponentLink2URL: https://jlcpcb.com/partdetail/C384769; ComponentLink3Description: LCSC Part URL; ComponentLink3URL: https://lcsc.com/product-detail/Multilayer-Ceramic-Capacitors-MLCC---SMD-SMT_Walsin-Tech-Corp-Walsin-Tech-Corp-0805B153J250CT_C384769.html
footprint CAP-0805 (0805 (2012M) Capacitor)
pins: 1, 2

## 0805B153J500
designator C?  Capacitance: 15nF  (hidden comment: *)
Capacitor, Ceramic (MLCC), 15nF, ±5%, 50V, X7R, ±5%, SMD 0805; Manufacturer: Walsin Tech Corp; Manufacturer Part Number: 0805B153J500; Package Size: 0805; JLCPCB Basic Part: No; JLCPCB Part Number: C180251; Supplier 1: LCSC; Category: Capacitors - MLCC; Supplier Part Number 1: C180251; Tolerance: ±5%; Voltage Rating: 50V; Temperature Coefficient: X7R; RoHS: Yes; ComponentLink1Description: Datasheet; ComponentLink1URL: https://wmsc.lcsc.com/wmsc/upload/file/pdf/v2/lcsc/2304140030_Walsin-Tech-Corp-0805B153J500_C180251.pdf; ComponentLink2Description: JLCPCB Part URL; ComponentLink2URL: https://jlcpcb.com/partdetail/C180251; ComponentLink3Description: LCSC Part URL; ComponentLink3URL: https://lcsc.com/product-detail/Multilayer-Ceramic-Capacitors-MLCC---SMD-SMT_Walsin-Tech-Corp-Walsin-Tech-Corp-0805B153J500_C180251.html
footprint CAP-0805 (0805 (2012M) Capacitor)
pins: 1, 2

## 0805B153J500CT
designator C?  Capacitance: 15nF  (hidden comment: *)
Capacitor, Ceramic (MLCC), 15nF, ±5%, 50V, X7R, ±5%, SMD 0805; Manufacturer: Walsin Tech Corp; Manufacturer Part Number: 0805B153J500CT; Package Size: 0805; JLCPCB Basic Part: No; JLCPCB Part Number: C2909432; Supplier 1: LCSC; Category: Capacitors - MLCC; Supplier Part Number 1: C2909432; Tolerance: ±5%; Voltage Rating: 50V; Temperature Coefficient: X7R; RoHS: Yes; ComponentLink1Description: Datasheet; ComponentLink1URL: https://wmsc.lcsc.com/wmsc/upload/file/pdf/v2/lcsc/2110272130_Walsin-Tech-Corp-0805B153J500CT_C2909432.pdf; ComponentLink2Description: JLCPCB Part URL; ComponentLink2URL: https://jlcpcb.com/partdetail/C2909432; ComponentLink3Description: LCSC Part URL; ComponentLink3URL: https://lcsc.com/product-detail/Multilayer-Ceramic-Capacitors-MLCC---SMD-SMT_Walsin-Tech-Corp-Walsin-Tech-Corp-0805B153J500CT_C2909432.html
footprint CAP-0805 (0805 (2012M) Capacitor)
pins: 1, 2

## 0805B153K101CT
designator C?  Capacitance: 15nF  (hidden comment: *)
Capacitor, Ceramic (MLCC), 15nF, ±10%, 100V, X7R, ±10%, SMD 0805; Manufacturer: Walsin Tech Corp; Manufacturer Part Number: 0805B153K101CT; Package Size: 0805; JLCPCB Basic Part: No; JLCPCB Part Number: C458920; Supplier 1: LCSC; Category: Capacitors - MLCC; Supplier Part Number 1: C458920; Tolerance: ±10%; Voltage Rating: 100V; Temperature Coefficient: X7R; RoHS: Yes; ComponentLink1Description: Datasheet; ComponentLink1URL: https://wmsc.lcsc.com/wmsc/upload/file/pdf/v2/lcsc/2304140030_Walsin-Tech-Corp-0805B153K101CT_C458920.pdf; ComponentLink2Description: JLCPCB Part URL; ComponentLink2URL: https://jlcpcb.com/partdetail/C458920; ComponentLink3Description: LCSC Part URL; ComponentLink3URL: https://lcsc.com/product-detail/Multilayer-Ceramic-Capacitors-MLCC---SMD-SMT_Walsin-Tech-Corp-Walsin-Tech-Corp-0805B153K101CT_C458920.html
footprint CAP-0805 (0805 (2012M) Capacitor)
pins: 1, 2

## 0805B153K201CT
designator C?  Capacitance: 15nF  (hidden comment: *)
Capacitor, Ceramic (MLCC), 15nF, ±10%, 200V, X7R, ±10%, SMD 0805; Manufacturer: Walsin Tech Corp; Manufacturer Part Number: 0805B153K201CT; Package Size: 0805; JLCPCB Basic Part: No; JLCPCB Part Number: C458921; Supplier 1: LCSC; Category: Capacitors - MLCC; Supplier Part Number 1: C458921; Tolerance: ±10%; Voltage Rating: 200V; Temperature Coefficient: X7R; RoHS: Yes; ComponentLink1Description: Datasheet; ComponentLink1URL: https://wmsc.lcsc.com/wmsc/upload/file/pdf/v2/lcsc/2304140030_Walsin-Tech-Corp-0805B153K201CT_C458921.pdf; ComponentLink2Description: JLCPCB Part URL; ComponentLink2URL: https://jlcpcb.com/partdetail/C458921; ComponentLink3Description: LCSC Part URL; ComponentLink3URL: https://lcsc.com/product-detail/Multilayer-Ceramic-Capacitors-MLCC---SMD-SMT_Walsin-Tech-Corp-Walsin-Tech-Corp-0805B153K201CT_C458921.html
footprint CAP-0805 (0805 (2012M) Capacitor)
pins: 1, 2

## 0805B153K251NT
designator C?  Capacitance: 15nF  (hidden comment: *)
Capacitor, Ceramic (MLCC), 15nF, ±10%, 250V, X7R, ±10%, SMD 0805; Manufacturer: FH (Guangdong Fenghua Advanced Tech); Manufacturer Part Number: 0805B153K251NT; Package Size: 0805; JLCPCB Basic Part: No; JLCPCB Part Number: C3037661; Supplier 1: LCSC; Category: Capacitors - MLCC; Supplier Part Number 1: C3037661; Tolerance: ±10%; Voltage Rating: 250V; Temperature Coefficient: X7R; RoHS: Yes; ComponentLink1Description: Datasheet; ComponentLink1URL: https://wmsc.lcsc.com/wmsc/upload/file/pdf/v2/lcsc/2206171645_FH--Guangdong-Fenghua-Advanced-Tech-0805B153K251NT_C3037661.pdf; ComponentLink2Description: JLCPCB Part URL; ComponentLink2URL: https://jlcpcb.com/partdetail/C3037661; ComponentLink3Description: LCSC Part URL; ComponentLink3URL: https://lcsc.com/product-detail/Multilayer-Ceramic-Capacitors-MLCC---SMD-SMT_FH-Guangdong-Fenghua-Advanced-Tech-FH-Guangdong-Fenghua-Advanced-Tech-0805B153K251NT_C3037661.html
footprint CAP-0805 (0805 (2012M) Capacitor)
pins: 1, 2

## 0805B153K500CT
designator C?  Capacitance: 15nF  (hidden comment: *)
Capacitor, Ceramic (MLCC), 15nF, ±10%, 50V, X7R, ±10%, SMD 0805; Manufacturer: Walsin Tech Corp; Manufacturer Part Number: 0805B153K500CT; Package Size: 0805; JLCPCB Basic Part: No; JLCPCB Part Number: C152883; Supplier 1: LCSC; Category: Capacitors - MLCC; Supplier Part Number 1: C152883; Tolerance: ±10%; Voltage Rating: 50V; Temperature Coefficient: X7R; RoHS: Yes; ComponentLink1Description: Datasheet; ComponentLink1URL: https://wmsc.lcsc.com/wmsc/upload/file/pdf/v2/lcsc/2304140030_Walsin-Tech-Corp-0805B153K500CT_C152883.pdf; ComponentLink2Description: JLCPCB Part URL; ComponentLink2URL: https://jlcpcb.com/partdetail/C152883; ComponentLink3Description: LCSC Part URL; ComponentLink3URL: https://lcsc.com/product-detail/Multilayer-Ceramic-Capacitors-MLCC---SMD-SMT_Walsin-Tech-Corp-Walsin-Tech-Corp-0805B153K500CT_C152883.html
footprint CAP-0805 (0805 (2012M) Capacitor)
pins: 1, 2
